# Altium schematic symbol library LTSpiceLibrary.SchLib: 776 symbols (part 1 of 3) (continued)
## ADA4528-2 (continued)
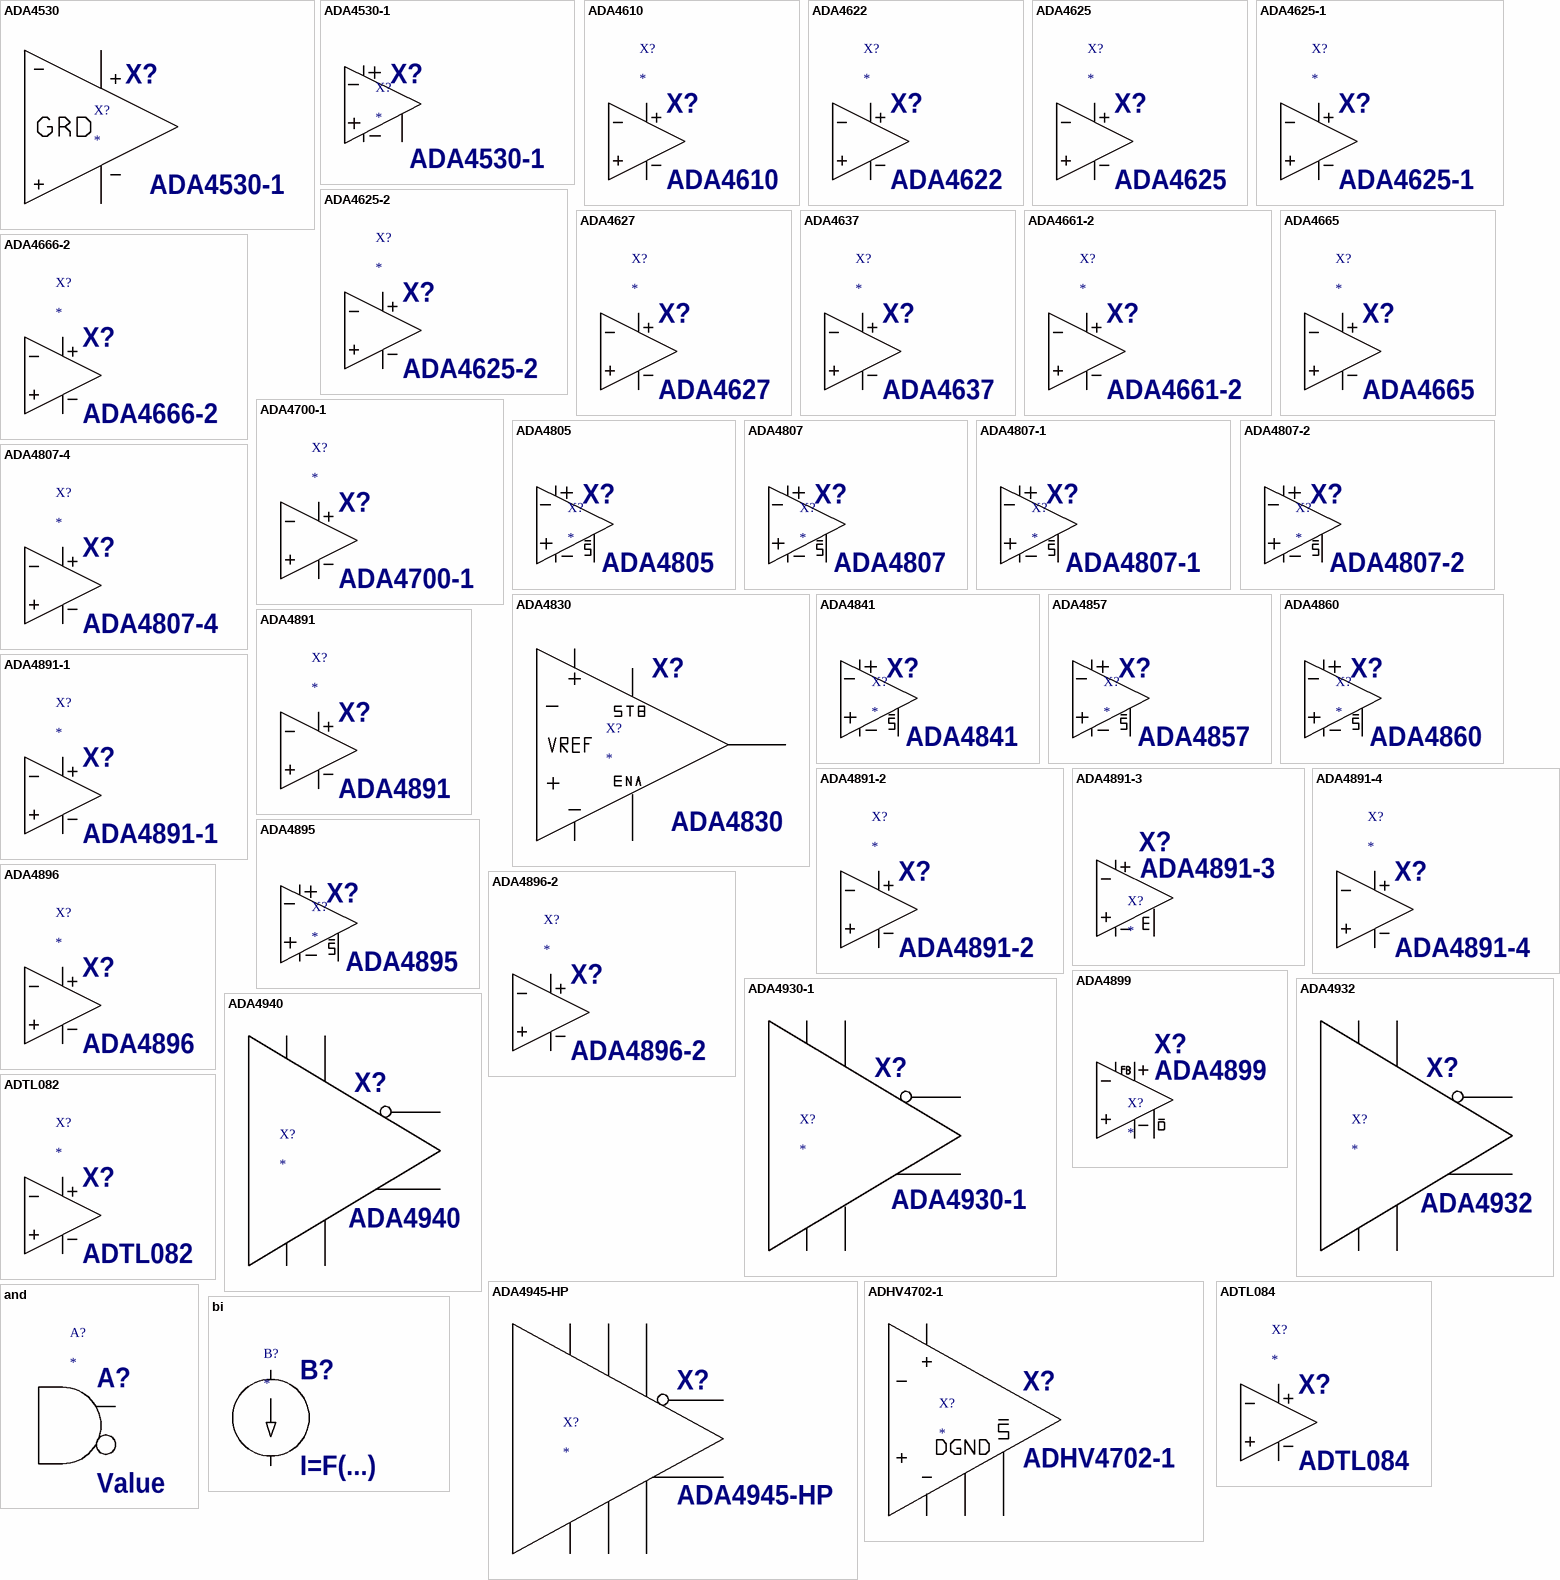
[diagram p4: symbols ADA4530 to bi]

## ADA4530
designator X?  value ADA4530-1  InstName: X?
Prefix: X; Description: Femtoampere Input Bias Current Electrometer Amplifier; SpiceModel: ADI1.lib; Value2: ADA4530-1
pins: 1 GRD, 2 IN+, 3 In-, 4 V-, 5 OUT, 6 V+

## ADA4530-1
designator X?  value ADA4530-1  InstName: X?
Prefix: X; Description: Femtoampere Input Bias Current Electrometer Amplifier; SpiceModel: ADI1.lib; Value2: ADA4530-1
pins: 1 In+, 2 In-, 3 V+, 4 V-, 5 OUT, 6 GDR

## ADA4610
designator X?  value ADA4610  InstName: X?
Prefix: X; Description: Low Noise Precision Rail to Rail Output JFET Single/Dual/Quad Op Amp; SpiceModel: ADA4610.lib; Value2: ADA4610
pins: 1 In+, 2 In-, 3 V+, 4 V-, 5 OUT

## ADA4622
designator X?  value ADA4622  InstName: X?
Prefix: X; Description: 30V 8 MHz Low Bias Current Single-Supply RRO Precision Single/Dual/Quad Op Amp; SpiceModel: ADA4622.lib; Value2: ADA4622
pins: 1 In+, 2 In-, 3 V+, 4 V-, 5 OUT

## ADA4625
designator X?  value ADA4625  InstName: X?
Prefix: X; Description: 36V, 18MHz, Low Noise, Fast Settling Single Supply, RRO, JFET Op Amp; Value2: ADA4625-1; SpiceModel: ADA4625-1.lib
pins: 1 In+, 2 In-, 3 V+, 4 V-, 5 OUT

## ADA4625-1
designator X?  value ADA4625-1  InstName: X?
Prefix: X; Description: 36V, 18MHz, Low Noise, Fast Settling Single Supply, RRO, JFET Op Amp; SpiceModel: ADA4625-1.lib; Value2: ADA4625-1
pins: 1 In+, 2 In-, 3 V+, 4 V-, 5 OUT

## ADA4625-2
designator X?  value ADA4625-2  InstName: X?
Prefix: X; Description: Dual 36V, 18MHz, Low Noise, Fast Settling Single Supply, RRO, JFET Op Amp; SpiceModel: ADA4625-2.lib; Value2: ADA4625-2
pins: 1 In+, 2 In-, 3 V+, 4 V-, 5 OUT

## ADA4627
designator X?  value ADA4627  InstName: X?
Prefix: X; Description: 30V High Speed Low Bias Current JFET OP Amp; SpiceModel: ADI1.lib; Value2: ADA4627
pins: 1 In+, 2 In-, 3 V+, 4 V-, 5 OUT

## ADA4637
designator X?  value ADA4637  InstName: X?
Prefix: X; Description: 30 V, High Speed, Low Noise, Low Bias Current, JFET Operational Amplifier; Value2: ADA4637; SpiceModel: ADI1.lib
pins: 1 In+, 2 In-, 3 V+, 4 V-, 5 OUT

## ADA4661-2
designator X?  value ADA4661-2  InstName: X?
Prefix: X; Description: Dual 18 V, Precision, 725 �A, 4 MHz CMOS RRIO Operational Amplifier; SpiceModel: ADA4661-2.lib; Value2: ADA4661-2
pins: 1 In+, 2 In-, 3 V+, 4 V-, 5 OUT

## ADA4665
designator X?  value ADA4665  InstName: X?
Prefix: X; Description: 5/16V CMOS OP Low Pwr RRIO; SpiceModel: ADI.lib; Value2: ADA4665
pins: 1 In+, 2 In-, 3 V+, 4 V-, 5 OUT

## ADA4666-2
designator X?  value ADA4666-2  InstName: X?
Prefix: X; Description: Dual 18 V, 725 �A, 4 MHz CMOS RRIO Operational Amplifie; SpiceModel: ADI1.lib; Value2: ADA4666-2
pins: 1 In+, 2 In-, 3 V+, 4 V-, 5 OUT

## ADA4700-1
designator X?  value ADA4700-1  InstName: X?
Prefix: X; Description: High Voltage, Precision Operational Amplifier; SpiceModel: ADI1.lib; Value2: ADA4700-1
pins: 1 In+, 2 In-, 3 V+, 4 V-, 5 OUT

## ADA4805
designator X?  value ADA4805  InstName: X?
Prefix: X; Description: Ultra Low Power 120Mhz High Sp R/R Amp; SpiceModel: ADI.lib; Value2: ADA4805
pins: 1 100, 2 101, 3 102, 4 103, 5 104, 6 106

## ADA4807
designator X?  value ADA4807  InstName: X?
Prefix: X; Description: 3.1nV/"Hz, 1mA, 180MHz, Rail-to-Rail Input/Output Amplifier; SpiceModel: ADA4807.lib; Value2: ADA4807
pins: 1 100, 2 101, 3 102, 4 103, 5 104, 6 106

## ADA4807-1
designator X?  value ADA4807-1  InstName: X?
Prefix: X; Value2: ADA4807; Description: 3.1nV/"Hz, 1mA, 180MHz, Rail-to-Rail Input/Output Amplifier; SpiceModel: ADA4807.lib
pins: 1 100, 2 101, 3 102, 4 103, 5 104, 6 106

## ADA4807-2
designator X?  value ADA4807-2  InstName: X?
Prefix: X; Value2: ADA4807; Description: Dual 3.1nV/"Hz, 1mA, 180MHz, Rail-to-Rail Input/Output Amplifier; SpiceModel: ADA4807.lib
pins: 1 100, 2 101, 3 102, 4 103, 5 104, 6 106

## ADA4807-4
designator X?  value ADA4807-4  InstName: X?
Prefix: X; Description: Quad 3.1nV/"Hz, 1mA, 180MHz, Rail-to-Rail Input/Output Amplifier; SpiceModel: ADA4807-4.lib; Value2: ADA4807-4
pins: 1 In+, 2 In-, 3 V+, 4 V-, 5 OUT

## ADA4830
designator X?  value ADA4830  InstName: X?
Prefix: X; Description: 10GHz GBW, 1.1nV/ Hz� Differential Amplifier/ADC Driver; SpiceModel: ADI1.lib; Value2: ADA4830
pins: 1 VREF, 2 IN+, 3 IN-, 4 V+, 5 V-, 6 ENA, 7 STB, 8 OUT

## ADA4841
designator X?  value ADA4841  InstName: X?
Prefix: X; Description: Low Power Low Noise OpAmp; SpiceModel: ADI.lib; Value2: ADA4841
pins: 1 NI, 2 IN, 3 +V, 4 -V, 5 OUT, 6 _D

## ADA4857
designator X?  value ADA4857  InstName: X?
Prefix: X; Description: Ultralow Distortion, Low Power, Low Noise, High Speed Op Amp, Single/Dual; SpiceModel: ADI1.lib; Value2: ADA4857
pins: 1 100, 2 101, 3 102, 4 103, 5 104, 6 106

## ADA4860
designator X?  value ADA4860  InstName: X?
Prefix: X; Description: High Speed, Low Cost,Op Amp; SpiceModel: ADI1.lib; Value2: ADA4860
pins: 1, 2, 3 Vcc, 4 Vee, 5 Vout, 6 PD

## ADA4891
designator X?  value ADA4891  InstName: X?
Prefix: X; Value2: ADA4891-1; Description: Low Cost CMOS, High Speed, Rail-to-Rail Amplifier; SpiceModel: ADA4891-1.lib
pins: 1 In+, 2 In-, 3 V+, 4 V-, 5 OUT

## ADA4891-1
designator X?  value ADA4891-1  InstName: X?
Prefix: X; Description: Low Cost CMOS, High Speed, Rail-to-Rail Amplifier; SpiceModel: ADA4891-1.lib; Value2: ADA4891-1
pins: 1 In+, 2 In-, 3 V+, 4 V-, 5 OUT

## ADA4891-2
designator X?  value ADA4891-2  InstName: X?
Prefix: X; Value2: ADA4891-1; Description: Low Cost CMOS, High Speed, Rail-to-Rail Amplifier; SpiceModel: ADA4891-1.lib
pins: 1 In+, 2 In-, 3 V+, 4 V-, 5 OUT

## ADA4891-3
designator X?  value ADA4891-3  InstName: X?
Prefix: X; Description: Low Cost CMOS, High Speed, Rail-to-Rail Amplifier; SpiceModel: ADA4891-3.lib; Value2: ADA4891-3
pins: 1 In+, 2 In-, 3 V+, 4 V-, 5 OUT, 6 SHDN

## ADA4891-4
designator X?  value ADA4891-4  InstName: X?
Prefix: X; Description: Low Cost CMOS, High Speed, Rail-to-Rail Amplifier; SpiceModel: ADA4891-4.lib; Value2: ADA4891-4
pins: 1 In+, 2 In-, 3 V+, 4 V-, 5 OUT

## ADA4895
designator X?  value ADA4895  InstName: X?
Prefix: X; Description: Low Power 1nV/"Hz G=10 Stable RRO Opamp; SpiceModel: ADA4895.lib; Value2: ADA4895
pins: 1 100, 2 101, 3 102, 4 103, 5 104, 6 106

## ADA4896
designator X?  value ADA4896  InstName: X?
Prefix: X; Description: Low Noise Low Power R/R Op Amp; SpiceModel: ADI.lib; Value2: ADA4896
pins: 1 In+, 2 In-, 3 V+, 4 V-, 5 OUT

## ADA4896-2
designator X?  value ADA4896-2  InstName: X?
Prefix: X; Value2: ADA4896; Description: Low Noise Low Power R/R Op Amp; SpiceModel: ADI.lib
pins: 1 In+, 2 In-, 3 V+, 4 V-, 5 OUT

## ADA4899
designator X?  value ADA4899  InstName: X?
Prefix: X; Description: 1nV/rtHz Voltage Noise, High-speed Op-amp; SpiceModel: ADA4899.lib; Value2: ADA4899
pins: 1 IN+, 2 IN-, 3 V+, 4 V-, 5 OUT, 6 FB, 7 PD

## ADA4930-1
designator X?  value ADA4930-1  InstName: X?
Prefix: X; Description: Ultralow Power, Low Distortion, Fully Differential ADC Driver; SpiceModel: ADA4930-1.lib; Value2: ADA4930-1
pins: 1, 2, 3, 4, 5, 6, 7, 8, 9, 10

## ADA4932
designator X?  value ADA4932  InstName: X?
Prefix: X; Description: Low Power, Differential ADC Driver; SpiceModel: ADA4932.lib; Value2: ADA4932
pins: 1 FBN, 2 VinP, 3 VinN, 4 FBP, 5 VCC, 6 VEE, 7 VoN, 8 VoP, 9 PD, 10 VOCM

## ADA4940
designator X?  value ADA4940  InstName: X?
Prefix: X; Description: Ultralow Power, Low Distortion, Fully Differential ADC Driver; SpiceModel: ADA4940.lib; Value2: ADA4940
pins: 1, 2, 3, 4, 5, 6, 7, 8, 9, 10

## ADA4945-HP
designator X?  value ADA4945-HP  InstName: X?
Prefix: X; Description: Ultralow Power, Low Distortion, Fully Differential ADC Driver; SpiceModel: ADA4945-HP.lib; Value2: ADA4945-HP
pins: 1, 2, 3, 4, 5, 6, 7, 8, 9, 10, 11, 12, 13

## ADHV4702-1
designator X?  value ADHV4702-1  InstName: X?
Prefix: X; Description: 24V to 220V Precision Operational Amplifier; SpiceModel: ADHV4702-1.lib; Value2: ADHV4702-1
pins: 1 IN+, 2 IN-, 3 OUT, 4 V+, 5 V-, 6 DGND, 7 _SHDN

## ADTL082
designator X?  value ADTL082  InstName: X?
Prefix: X; Description: Dual Low Cost JFET Input Operational Amplifier; SpiceModel: ADI.lib; Value2: ADTL082
pins: 1 In+, 2 In-, 3 V+, 4 V-, 5 OUT

## ADTL084
designator X?  value ADTL084  InstName: X?
Prefix: X; Value2: ADTL082; Description: Quad Low Cost JFET Input Operational Amplifier; SpiceModel: ADI.lib
pins: 1 In+, 2 In-, 3 V+, 4 V-, 5 OUT

## and
designator A?  InstName: A?
Prefix: A; Description: Behavioral AND gate; Value: Value; SpiceModel: AND
pins: 1 a, 2 b, 3 c, 4 d, 5 e, 6 _Q, 7 Q, 8 com

## bi
designator B?  value I=F(...)  InstName: B?
Prefix: B; Description: Arbitrary behavioral current source
pins: 1 +, 2 -

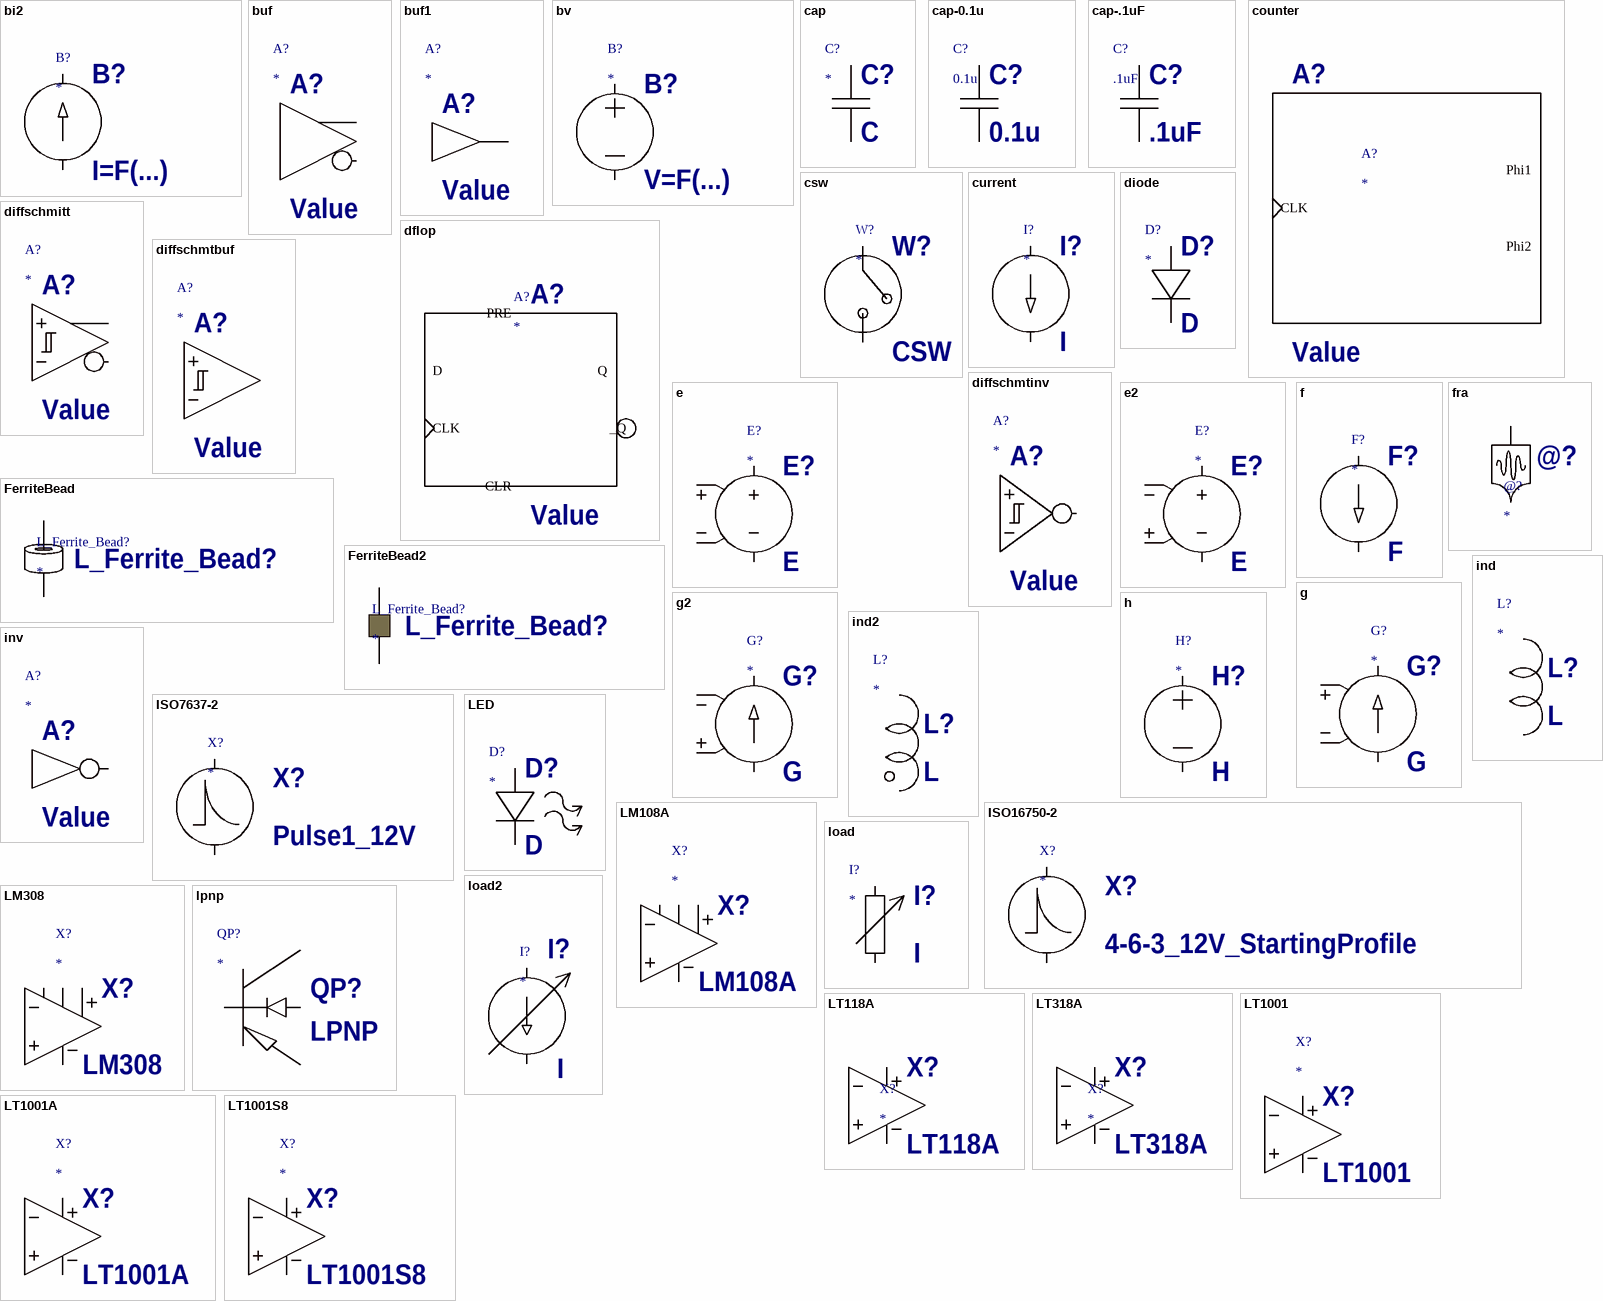
[diagram p5: symbols bi2 to LT1001S8]

## bi2
designator B?  value I=F(...)  InstName: B?
Prefix: B; Description: Arbitrary behavioral current source
pins: 1 +, 2 -

## buf
designator A?  InstName: A?
Prefix: A; Description: Behavioral buffer with complementary outputs; Value: Value; SpiceModel: BUF
pins: 1 in, 2 _Q, 3 Q, 4 com

## buf1
designator A?  InstName: A?
Prefix: A; Description: Behavioral buffer; Value: Value; SpiceModel: BUF
pins: 1 in, 2 Q, 3 com

## bv
designator B?  value V=F(...)  InstName: B?
V= voltage source; Prefix: B; Description: Arbitrary behavioral voltage source
simulation model bv
pins: 1 +, 2 -

## cap
designator C?  value C  InstName: C?
Description: Capacitor; Prefix: C
pins: 1 A, 2 B

## cap-0.1u
designator C?, comment 0.1u  InstName: C?
Prefix: C; Description: Capacitor; Value: 0.1u
simulation model cap-0.1u
pins: 1 A, 2 B

## cap-.1uF
designator C?, comment .1uF  InstName: C?
Prefix: C; Description: Capacitor; Value: .1uF
simulation model cap-.1uF
pins: 1 A, 2 B

## counter
designator A?  InstName: A?
Prefix: A; Description: Behavioral counter; Value: Value; SpiceModel: COUNTER
pins: 1 CLK, 2 Phi2, 3 Phi1, 4 com

## csw
designator W?  value CSW  InstName: W?
Prefix: W; Description: Current controlled switch
pins: 1 +, 2 -

## current
designator I?  value I  InstName: I?
Description: Current source, either DC, AC, PULSE, SINE, PWL, EXP, or SFFM; Prefix: I
pins: 1 +, 2 -

## dflop
designator A?  InstName: A?
Prefix: A; Description: Behavioral D-flipflop; Value: Value; SpiceModel: DFLOP
pins: 1 D, 2 CLK, 3 PRE, 4 CLR, 5 _Q, 6 Q, 7 com

## diffschmitt
designator A?  InstName: A?
Prefix: A; Description: Behavioral Schmitt-Triggered Buffer with Complementary Outs and Differential Input; Value: Value; SpiceModel: SCHMITT
pins: 1 in+, 2 in-, 3 _Q, 4 Q, 5 com

## diffschmtbuf
designator A?  InstName: A?
Prefix: A; Description: Behavioral Schmitt-Triggered Buffer with Differential Input; Value: Value; SpiceModel: SCHMITT
pins: 1 in+, 2 in-, 3 Q, 4 com

## diffschmtinv
designator A?  InstName: A?
Prefix: A; Description: Behavioral Schmitt-Triggered Inverter with Differential Input; Value: Value; SpiceModel: SCHMITT
pins: 1 in+, 2 in-, 3 _Q, 4 com

## diode
designator D?  value D  InstName: D?
Description: Diode; Prefix: D
pins: 1 +, 2 -

## e
designator E?  value E  InstName: E?
Description: Voltage dependent voltage source; Prefix: E
pins: 1 +, 2 -, 3 P, 4 N

## e2
designator E?  value E  InstName: E?
Description: Voltage dependent voltage source; Prefix: E
pins: 1 +, 2 -, 3 P, 4 N

## f
designator F?  value F  InstName: F?
Description: Linear current dependent current source; Prefix: F
pins: 1 +, 2 -

## FerriteBead
designator L_Ferrite_Bead?  InstName: L_Ferrite_Bead?
Prefix: L_Ferrite_Bead; Description: A Ferrite Bead; Value: Value
pins: 1 A, 2 B

## FerriteBead2
designator L_Ferrite_Bead?  InstName: L_Ferrite_Bead?
Prefix: L_Ferrite_Bead; Description: A Ferrite Bead(Alternate symbol); Value: Value
pins: 1 A, 2 B

## fra
designator @?  InstName: @?
Prefix: @; Description: Frequency Response Analyzer; Value: Value
pins: 1 OUT, 2 IN

## g
designator G?  value G  InstName: G?
Description: Voltage dependent current source; Prefix: G
pins: 1 +, 2 -, 3 NC+, 4 NC-

## g2
designator G?  value G  InstName: G?
Description: Voltage dependent current source; Prefix: G
pins: 1 +, 2 -, 3 NC+, 4 NC-

## h
designator H?  value H  InstName: H?
Description: Linear current dependent voltage source; Prefix: H
pins: 1 +, 2 -

## ind
designator L?  value L  InstName: L?
Description: Inductor; Prefix: L
pins: 1 A, 2 B

## ind2
designator L?  value L  InstName: L?
Description: Inductor; Prefix: L
pins: 1 A, 2 B

## inv
designator A?  InstName: A?
Prefix: A; Description: Behavioral Inverter; Value: Value; SpiceModel: BUF
pins: 1 in, 2 _Q, 3 com

## ISO7637-2
designator X?  InstName: X?  SpiceModel: Pulse1_12V
Description: ISO-7637-2 Transeints; Prefix: X; ModelFile: ISO7637-2.lib; Value: Value
pins: 1 +, 2 -

## ISO16750-2
designator X?  InstName: X?  SpiceModel: 4-6-3_12V_StartingProfile
Description: ISO-16750-2 Transients; Prefix: X; ModelFile: ISO16750-2.lib; Value: Value
pins: 1 +, 2 -

## LED
designator D?  value D  InstName: D?
Description: Light Emitting Diode; Prefix: D
pins: 1 +, 2 -

## LM108A
designator X?  value LM108A  InstName: X?
Prefix: X; Value2: LT1008; Description: Picoamp Input Current, �Volt Offset, Low Noise Operational Amplifier; SpiceModel: LTC.lib
pins: 1 In+, 2 In-, 3 V+, 4 V-, 5 OUT, 6 COMP1, 7 COMP2

## LM308
designator X?  value LM308  InstName: X?
Prefix: X; Value2: LT1008; Description: Picoamp Input Current, �Volt Offset, Low Noise Operational Amplifier; SpiceModel: LTC.lib
pins: 1 In+, 2 In-, 3 V+, 4 V-, 5 OUT, 6 COMP1, 7 COMP2

## load
designator I?  value I  InstName: I?
Description: Current Source, either DC, AC, PULSE, SINE, PWL, EXP, or SFFM; Prefix: I
pins: 1 A, 2 B

## load2
designator I?  value I  InstName: I?
Description: Current Source, either DC, AC, PULSE, SINE, PWL, EXP, or SFFM; Prefix: I
pins: 1 +, 2 -

## lpnp
designator QP?  value LPNP  InstName: QP?
Prefix: QP; Description: Bipolar Lateral PNP transistor.  You would normally use this with your own .model statement.
pins: 1 C, 2 B, 3 E, 4 S

## LT118A
designator X?  value LT118A  InstName: X?
Prefix: X; Description: High Speed Operational Amplifier; SpiceModel: LTC.lib; Value2: LT118A
pins: 1 In+, 2 In-, 3 V+, 4 V-, 5 OUT

## LT318A
designator X?  value LT318A  InstName: X?
Prefix: X; Value2: LT118A; Description: High Speed Operational Amplifier; SpiceModel: LTC.lib
pins: 1 In+, 2 In-, 3 V+, 4 V-, 5 OUT

## LT1001
designator X?  value LT1001  InstName: X?
Prefix: X; Description: Precision Operational Amplifier; SpiceModel: LTC.lib; Value2: LT1001
pins: 1 In+, 2 In-, 3 V+, 4 V-, 5 OUT

## LT1001A
designator X?  value LT1001A  InstName: X?
Prefix: X; Value2: LT1001; Description: Precision Operational Amplifier; SpiceModel: LTC.lib
pins: 1 In+, 2 In-, 3 V+, 4 V-, 5 OUT

## LT1001S8
designator X?  value LT1001S8  InstName: X?
Prefix: X; Value2: LT1001; Description: Precision Operational Amplifier; SpiceModel: LTC.lib
pins: 1 In+, 2 In-, 3 V+, 4 V-, 5 OUT
